# Altium footprint library 3.22-杂项.PcbLib: 985 footprints (part 46 of 64)
Each footprint in its own frame and in the unit in brackets; x right, y up, seen from the top. Pads: shape width x height; smd on the part's side, far side on the other; paste and mask are expansions set on the pad; w line width, h text height; cw(c..) or ccw(c..) is an arc to the next point about the centre after c.
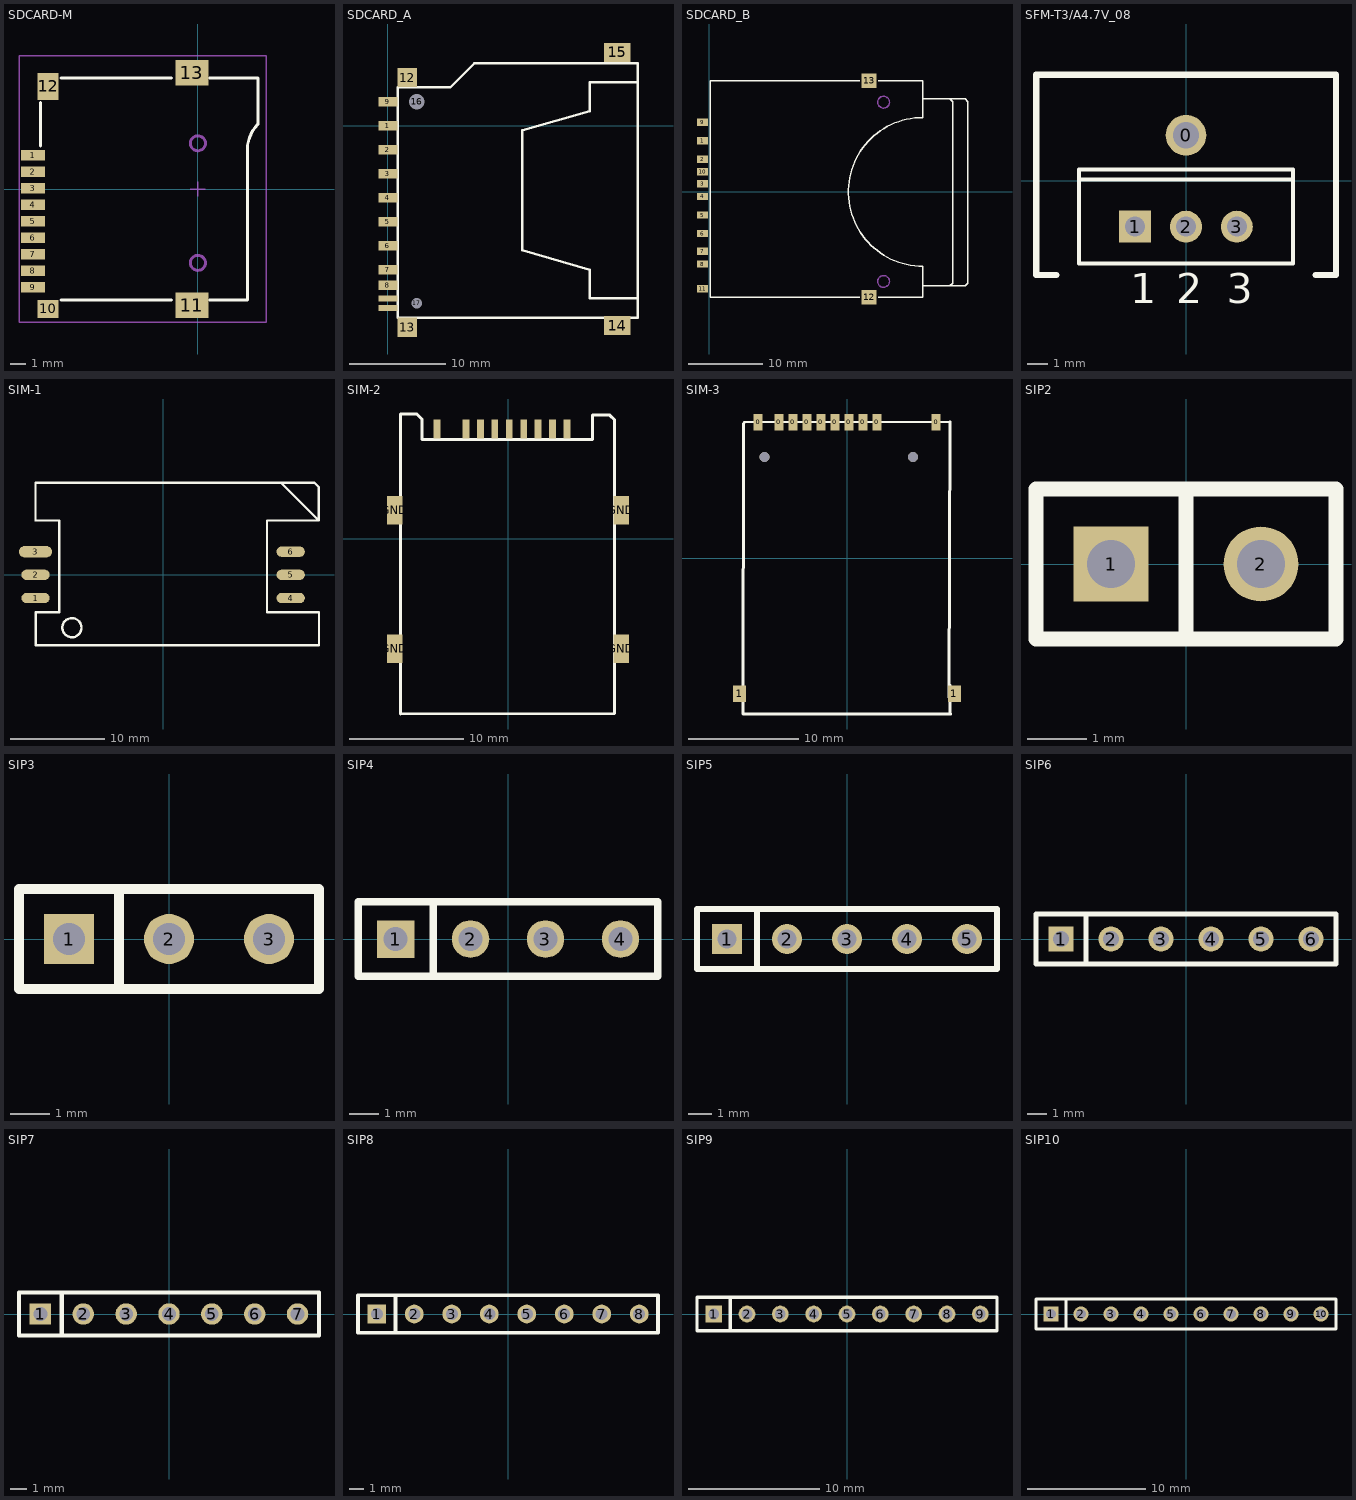
[diagram p45: the footprints below, top view; thin cyan lines are the x and y axes]

## SDCARD-M [mm] "TF卡"
height 1.5
pads (13):
  rect 1.6x0.7 smd: 1(-11.008,2.25) 2(-11.008,1.15) 3(-11.008,0.05) 4(-11.008,-1.05) 5(-11.008,-2.15) 6(-11.008,-3.25) 7(-11.008,-4.35) 8(-11.008,-5.45) 9(-11.008,-6.55)
  rect 1.4x1.2 smd: 10(-10,-8.004)
  rect 2.2x1.7 smd: 11(-0.4,-7.75) 13(-0.4,7.75)
  rect 1.4x1.8 smd: 12(-10,6.85)
Top Overlay:
  lines w0.2: -10.5,2.88 -10.5,5.756 ; -9.144,-7.4 -1.778,-7.4 ; -9.144,7.4 -1.778,7.4 ; 0.762,-7.4 3.3,-7.4 3.3,1.016 ; 0.762,7.4 4,7.4 4,4.318 ccw(c5.69,2.628) 3.3,2.628 3.3,0.762
Mechanical 1:
  circle w0.2: c0,3.05 r0.5
  circle w0.2: c0,-4.93 r0.5
Mechanical 15:
  lines w0.1: -0.5,0 0.5,0 ; 0,-0.5 0,0.5 ; -11.938,-8.89 -11.938,8.89 4.572,8.89 4.572,-8.89 -11.938,-8.89

## SDCARD_A [mm] "SD卡不自弹"
pads (17):
  rect 2x1 smd: 1(0,0) 2(0,-2.5) 3(0,-5) 4(0,-7.5) 5(0,-10) 6(0,-12.5) 7(0,-15) 8(0,-16.625) 9(0,2.5)
  rect 2x0.6 smd: 10(0,-19) 11(0,-18)
  rect 2x2 smd: 12(2,5) 13(2,-21)
  rect 2.8x2 smd: 14(23.876,-20.828) 15(23.876,7.62)
  round 1.5 hole 1.6: 16(3,2.5)
  round 1 hole 1.1: 17(3,-18.5)
Top Overlay:
  lines w0.254: 26,-18 21,-18 21,-15 14,-13 14,-0.5 21,1.5 21,4.5 26,4.5 ; 1,-20 26,-20 26,6.5 9,6.5 6.5,4 1,4 1,-20

## SDCARD_B [mm] "SD卡自弹"
pads (13):
  rect 1.5x1 smd: 1(-0.889,6.88) 2(-0.889,4.38) 3(-0.889,1.08) 4(-0.889,-0.63) 5(-0.889,-3.13) 6(-0.889,-5.63) 7(-0.889,-8.05) 8(-0.889,-9.75) 9(-0.889,9.38) 10(-0.889,2.73) 11(-0.889,-13.1)
  rect 2x2 smd: 12(21.59,-14.224) 13(21.59,14.986)
Top Overlay:
  lines w0.2: 20.32,-14.224 0.127,-14.224 0.127,0 0.127,14.986 20.32,14.986 ; 22.86,-14.224 28.829,-14.224 28.829,-10.033 cw(c28.829,0) 28.829,10.033 28.829,14.986 22.86,14.986 ; 28.829,-12.7 32.893,-12.7 34.544,-12.7 34.925,-12.319 34.925,12.192 34.544,12.573 32.893,12.573 28.829,12.573 ; 32.512,-12.7 32.893,-12.319 32.893,12.192 32.512,12.573
Mechanical 1:
  circle w0.2: c23.55,12.1 r0.8
  circle w0.2: c23.55,-12.1 r0.8

## SFM-T3/A4.7V_08 [mm]
pads (4):
  round 2.032 hole 1.321: 0(0,2.286)
  rect 1.6x1.6 hole 1: 1(-2.54,-2.286)
  round 1.6 hole 1: 2(0,-2.286) 3(2.54,-2.286)
Top Overlay:
  lines w0.2: -5.35,0.064 5.35,0.064 ; -5.35,-4.136 -5.35,0.564 5.35,0.564 5.35,-4.136 -5.35,-4.136
  lines w0.305: -7.5,-4.692 -6.477,-4.692 ; -7.5,5.31 7.5,5.31 7.5,-4.692 6.477,-4.692 ; -7.486,-4.692 -7.486,5.31
  text "3" at 2.04,-6.111 h1.5
  text "1" at -2.79,-6.111 h1.5
  text "2" at -0.5,-6.111 h1.5

## SIM-1 [mm]
pads (6):
  oval 3x1.1 smd: 1(-13.5,-2.45) 2(-13.5,0) 4(13.5,-2.45) 5(13.5,0) 6(13.5,2.45)
  oval 3.5x1.2 smd: 3(-13.5,2.45)
Top Overlay:
  circle w0.254: c-9.652,-5.588 r1.016
  lines w0.254: -13.495,-7.43 -13.495,-3.95 -11,-3.95 -11,5.735 ; -13.475,-7.45 16.5,-7.45 ; -11,5.75 -13.492,5.75 -13.5,5.758 -13.5,9.75 16.011,9.75 16.467,9.294 16.467,5.75 ; 11,-3.95 11,5.75 16.467,5.75 ; 11.005,-3.95 14.923,-3.95 ; 12.467,9.75 16.467,5.75 ; 14.542,-3.95 16.495,-3.95 16.495,-7.445

## SIM-2 [mm]
pads (13):
  rect 0.6x1.65 smd: 0(-6.25,9.662) 0(-3.7,9.662) 0(-2.43,9.662) 0(-1.16,9.662) 0(0.11,9.662) 0(1.38,9.662) 0(2.65,9.662) 0(3.92,9.662) 0(5.19,9.662)
  rect 1.35x2.5 smd: GND(-9.95,-9.662) GND(-9.95,2.538) GND(9.95,-9.662) GND(9.95,2.537)
Top Overlay:
  lines w0.254: -9.44,-15.382 -9.44,10.983 -9.186,10.983 -8.018,10.983 -7.561,10.526 -7.561,8.748 7.425,8.748 7.425,10.882 8.949,10.882 9.356,10.475 9.356,-15.331 -9.44,-15.382

## SIM-3 [mm]
pads (12):
  rect 0.8x1.5 smd: 0(-8.07,12.325) 0(-6.17,12.325) 0(-4.9,12.325) 0(-3.63,12.325) 0(-2.36,12.325) 0(-1.09,12.325) 0(0.18,12.325) 0(1.45,12.325) 0(2.72,12.325) 0(8.08,12.325)
  rect 1.2x1.5 smd: 1(-9.75,-12.325) 1(9.75,-12.325)
via 6,9.175 diameter 0.9 hole 0.9
via -7.5,9.175 diameter 0.9 hole 0.9
Top Overlay:
  lines w0.254: 7.778,12.325 9.353,12.375 ; 9.251,-12.618 9.353,12.375 ; 9.353,-11.501 9.353,-14.091 9.404,-14.142 8.642,-14.142 -9.443,-14.142 -9.392,12.223 -9.291,12.325 9.353,12.375

## SIP2 [mil]
pads (2):
  rect 50x50 hole 32: 1(-50,0)
  round 50 hole 32: 2(50,0)
Top Overlay:
  lines w10: 0,-50 0,50 ; -100,-50 100,-50 100,50 -100,50 -100,-50

## SIP3 [mil]
pads (3):
  rect 50x50 hole 32: 1(-100,0)
  round 50 hole 32: 2(0,0) 3(100,0)
Top Overlay:
  lines w10: -50,-50 -50,50 ; -150,-50 -150,50 150,50 150,-50 -150,-50

## SIP4 [mil]
pads (4):
  rect 50x50 hole 32: 1(-150,0)
  round 50 hole 32: 2(-50,0) 3(50,0) 4(150,0)
Top Overlay:
  lines w10: -100,-50 -100,50 ; -200,-50 -200,50 200,50 200,-50 -200,-50

## SIP5 [mil]
pads (5):
  rect 50x50 hole 32: 1(-200,0)
  round 50 hole 32: 2(-100,0) 3(0,0) 4(100,0) 5(200,0)
Top Overlay:
  lines w10: -150,-50 -150,50 ; -250,-50 -250,50 250,50 250,-50 -250,-50

## SIP6 [mil]
pads (6):
  rect 50x50 hole 32: 1(-250,0)
  round 50 hole 32: 2(-150,0) 3(-50,0) 4(50,0) 5(150,0) 6(250,0)
Top Overlay:
  lines w10: -200,-50 -200,50 ; -300,-50 300,-50 300,50 -300,50 -300,-50

## SIP7 [mil]
pads (7):
  rect 50x50 hole 32: 1(-300,0)
  round 50 hole 32: 2(-200,0) 3(-100,0) 4(0,0) 5(100,0) 6(200,0) 7(300,0)
Top Overlay:
  lines w10: -250,-50 -250,50 ; -350,-50 350,-50 350,50 -350,50 -350,-50

## SIP8 [mil]
pads (8):
  rect 50x50 hole 32: 1(-350,0)
  round 50 hole 32: 2(-250,0) 3(-150,0) 4(-50,0) 5(50,0) 6(150,0) 7(250,0) 8(350,0)
Top Overlay:
  lines w10: -300,-50 -300,50 ; -400,-50 -400,50 400,50 400,-50 -400,-50

## SIP9 [mil]
pads (9):
  rect 50x50 hole 32: 1(-400,0)
  round 50 hole 32: 2(-300,0) 3(-200,0) 4(-100,0) 5(0,0) 6(100,0) 7(200,0) 8(300,0) 9(400,0)
Top Overlay:
  lines w10: -350,-50 -350,50 ; -450,-50 450,-50 450,50 -450,50 -450,-50

## SIP10 [mil]
pads (10):
  rect 50x50 hole 32: 1(-450,0)
  round 50 hole 32: 2(-350,0) 3(-250,0) 4(-150,0) 5(-50,0) 6(50,0) 7(150,0) 8(250,0) 9(350,0) 10(450,0)
Top Overlay:
  lines w10: -400,-50 -400,50 ; -500,-50 500,-50 500,50 -500,50 -500,-50